# Altium footprint library PcbLibLafe.PcbLib: 294 footprints (part 5 of 19)
Each footprint in its own frame and in the unit in brackets; x right, y up, seen from the top. Pads: shape width x height; smd on the part's side, far side on the other; paste and mask are expansions set on the pad; w line width, h text height; cw(c..) or ccw(c..) is an arc to the next point about the centre after c.
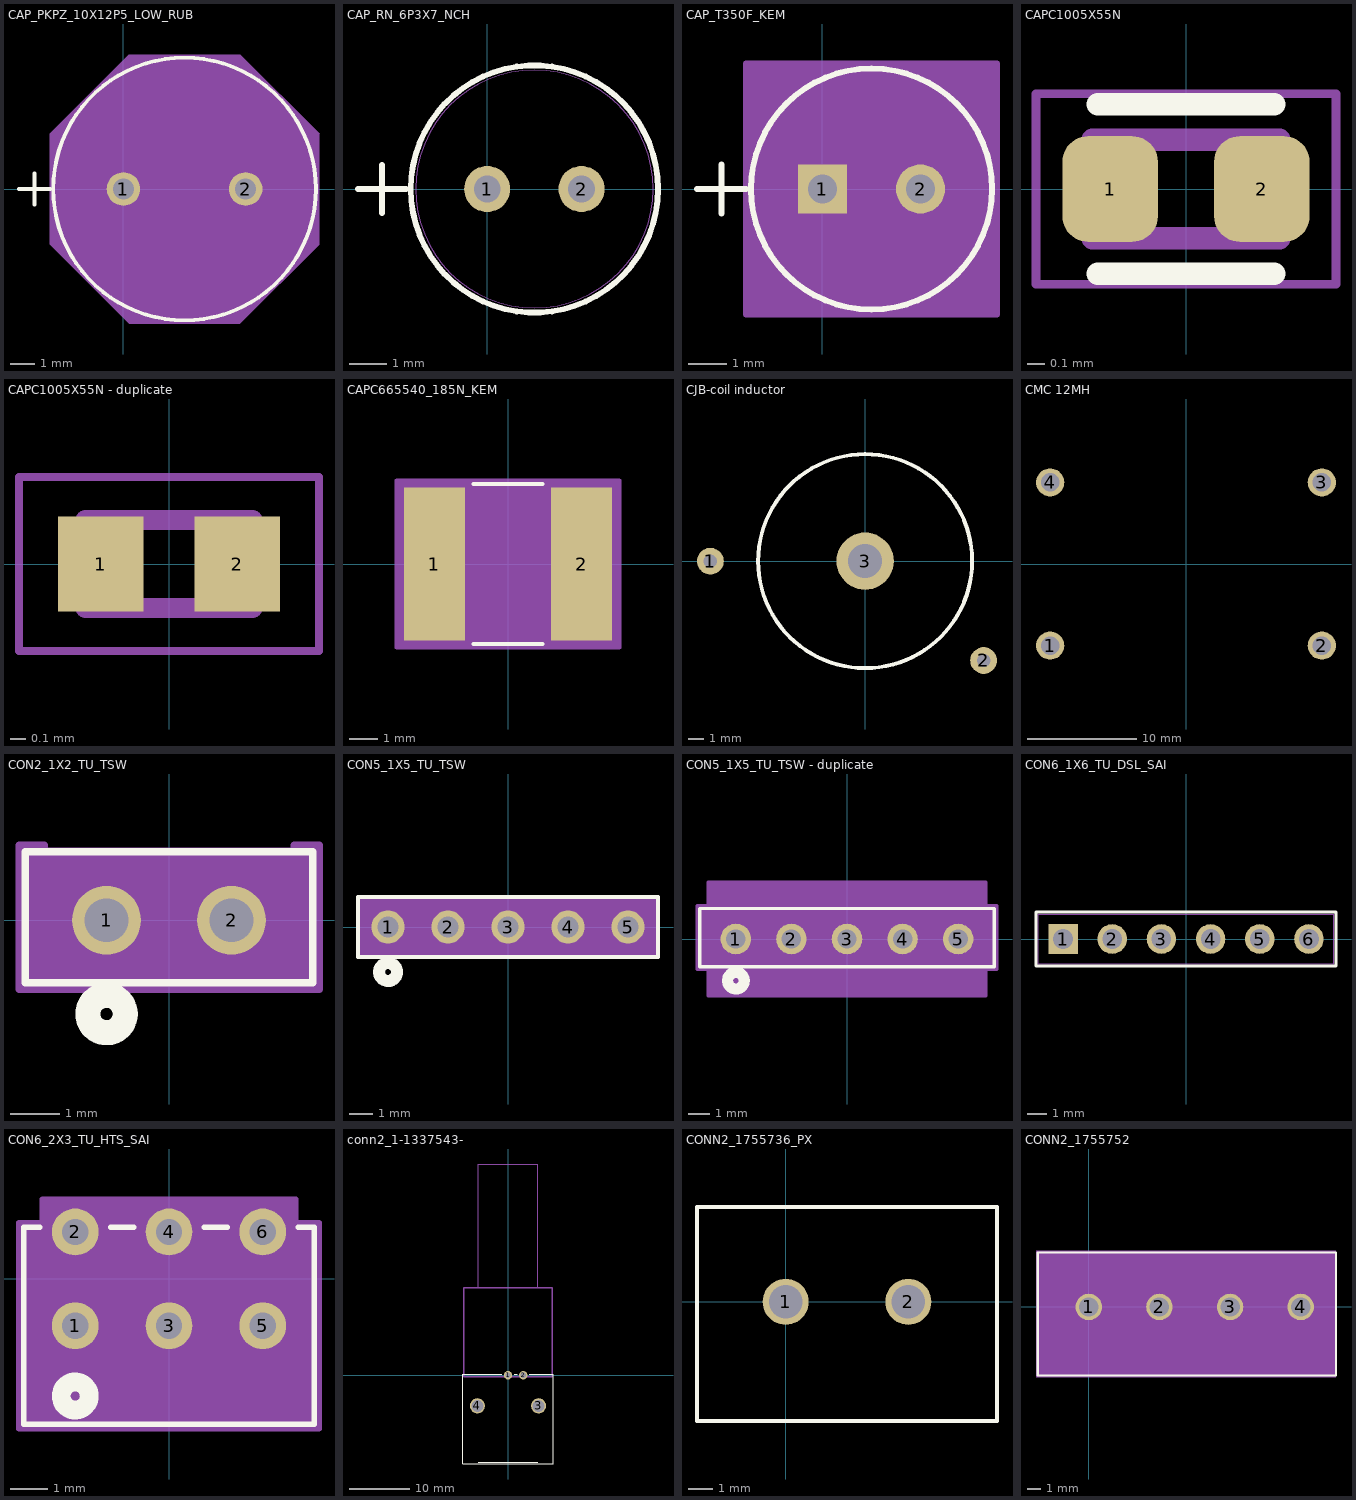
[diagram p4: the footprints below, top view; thin cyan lines are the x and y axes]

## CAP_PKPZ_10X12P5_LOW_RUB [mil]
pads (2):
  round 54 / inner round 60 / far side round 54 hole 34 paste-99999 mask+0: 1(0,0) 2(196.85,0)
Top Overlay:
  circle w6: c98.43,0 r211.5
  lines w6: -168.07,0 -118.07,0 ; -143.07,-25 -143.07,25
Mechanical 13:
  circle w0: c98.43,0 r206.5
  lines w1: -168.07,0 -118.07,0 ; -143.07,-25 -143.07,25
Mechanical 15:
  region: -118.07,89.15 9.28,216.5 187.57,216.5 314.93,89.15 314.93,-89.15 187.57,-216.5 9.28,-216.5 -118.07,-89.15
  lines w1: -118.07,-89.15 -118.07,89.15 9.28,216.5 187.57,216.5 314.93,89.15 314.93,-89.15 187.57,-216.5 9.28,-216.5 -118.07,-89.15
3D body "capacitor-90deg-leads.STEP": height 120.08, standoff -335.94, extent -107.57,-7.87 306.39,805.75

## CAP_RN_6P3X7_NCH [mil]
pads (2):
  round 48 hole 28 mask+0: 1(0,0) 2(98.43,0)
Top Overlay:
  circle w6: c49.21,0 r129
  lines w6: -134.79,0 -84.79,0 ; -109.79,-25 -109.79,25
Mechanical 13:
  circle w0: c49.21,0 r124
  lines w1: -134.79,0 -84.79,0 ; -109.79,-25 -109.79,25
3D body: height 10, standoff 0, extent 0,0 10,10
3D body "CAP_RN_6P3X7_NCH.step": height 315.63, standoff -154.02, extent -75.13,-123.87 173.21,123.88

## CAP_T350F_KEM [mil]
pads (2):
  rect 50x50 / inner round 60 / far side rect 50x50 hole 30 paste-99999 mask-25: 1(0,0)
  round 50 / inner round 60 / far side round 50 hole 30 paste-99999 mask-25: 2(100,0)
Top Overlay:
  circle w6: c50,0 r123
  lines w6: -128,0 -78,0 ; -103,-25 -103,25
Mechanical 13:
  circle w0: c50,0 r118
  lines w1: -128,0 -78,0 ; -103,-25 -103,25
Mechanical 15:
  region: 178,-128 -78,-128 -78,128 178,128
  lines w6: -78,-128 -78,128 178,128 178,-128 -78,-128
3D body "CAP_T350F_KEM.step": height 390, standoff -160, extent -67.99,-117.99 167.99,117.99

## CAPC1005X55N [mm]
pads (2):
  rrect53% 0.54x0.6 smd: 1(-0.43,0) 2(0.43,0)
Top Overlay:
  lines w0.127: -0.5,-0.48 0.5,-0.48 ; -0.5,0.48 0.5,0.48
Mechanical 13:
  lines w0.127: -0.53,-0.28 0.53,-0.28 0.53,0.28 -0.53,0.28 -0.53,-0.28
Mechanical 15:
  lines w0.05: -0.85,-0.54 0.85,-0.54 0.85,0.54 -0.85,0.54 -0.85,-0.54
3D body "step_temp.STEP": height 0.55, standoff 0, extent -0.5,-0.25 0.5,0.25

## CAPC1005X55N - duplicate [mm]
pads (2):
  rect 0.54x0.6 smd: 1(-0.432,0) 2(0.432,0)
Mechanical 13:
  lines w0.127: -0.53,-0.28 -0.53,0.28 0.53,0.28 0.53,-0.28 -0.53,-0.28
Mechanical 15:
  lines w0.05: -0.95,-0.55 -0.95,0.55 0.95,0.55 0.95,-0.55 -0.95,-0.55
3D body "step_temp.STEP": height 0.55, standoff 0, extent -0.5,-0.25 0.5,0.25

## CAPC665540_185N_KEM [mm]
pads (2):
  rect 2.156x5.4 smd paste+0 mask+0: 1(-2.603,0) 2(2.603,0)
Top Overlay:
  lines w0.152: -1.217,-2.827 1.217,-2.827 ; -1.217,2.827 1.217,2.827
Mechanical 13:
  lines w0.025: -3.325,-2.7 -3.325,2.7 ; -3.325,-2.7 -2.275,-2.7 -2.275,2.7 -3.325,2.7 ; -3.325,-2.7 3.325,-2.7 ; -3.325,-2.7 -3.325,2.7 ; -3.325,2.7 3.325,2.7 ; 3.325,-2.7 2.275,-2.7 2.275,2.7 3.325,2.7 ; 3.325,-2.7 3.325,2.7 ; 3.325,-2.7 3.325,2.7
Mechanical 15:
  region: 3.935,-2.954 -3.935,-2.954 -3.935,2.954 3.935,2.954
  lines w0.152: -3.935,-2.954 -3.935,2.954 3.935,2.954 3.935,-2.954 -3.935,-2.954
3D body "CAPC665540_185N_KEM.step": height 1.85, standoff 0, extent -3.325,-2.7 3.325,2.7

## CJB-coil inductor [mil]
pads (3):
  round 70 hole 35: 1(-405,0) 2(310,-260)
  round 150 hole 89: 3(0,0)
Top Overlay:
  circle w10: c0,0 r280

## CMC 12MH [mm]
pads (4):
  round 2.6 hole 1.7: 1(-12.5,-7.5) 2(12.5,-7.5) 3(12.5,7.5) 4(-12.5,7.5)
3D body "7448051012_Download_STP_7448051012_rev1.stp": height 29.75, standoff -5.9, extent -15.334,-10.3 15.334,10.3

## CON2_1X2_TU_TSW [mil]
pads (2):
  round 55 / inner round 60 / far side round 55 hole 35 paste-99999 mask+0: 1(-50,0) 2(50,0)
Top Overlay:
  circle w20: c-50,-75 r15
  lines w6: -115,-50 -115,55 115,55 115,-50 -115,-50
Bottom Overlay:
  circle w20: c-50,-75 r15
Mechanical 13:
  circle w0: c-50,0 r10
  lines w1: -110,-45 -110,50 110,50 110,-45 -110,-45
Mechanical 15:
  region: 120,58 100,58 -100,58 -120,58 -120,-57 -100,-57 100,-57 120,-57
  lines w6: -120,-55 -100,-55 100,-55 120,-55 120,60 100,60 100,50 -100,50 -100,60 -120,60 -120,-55

## CON5_1X5_TU_TSW [mil]
pads (5):
  round 55 / inner round 60 / far side round 55 hole 35 paste-99999 mask+0: 1(-200,0) 2(-100,0) 3(0,0) 4(100,0) 5(200,0)
Top Overlay:
  circle w20: c-200,-75 r15
  lines w6: -250,-50 -250,50 250,50 250,-50 -250,-50
Bottom Overlay:
  circle w20: c-200,-75 r15
Mechanical 13:
  circle w0: c-200,0 r10
  lines w1: -250,-45 -125,-45 125,-45 250,-45 250,50 -250,50 -250,-45
Mechanical 15:
  region: 250,50 -250,50 -250,-50 250,-50

## CON5_1X5_TU_TSW - duplicate [mil]
pads (5):
  round 55 / inner round 60 / far side round 55 hole 35 paste-99999 mask+0: 1(-200,0) 2(-100,0) 3(0,0) 4(100,0) 5(200,0)
Top Overlay:
  circle w20: c-200,-75 r15
  lines w6: -265,-50 265,-50 265,55 -265,55 -265,-50
Bottom Overlay:
  circle w20: c-200,-75 r15
Mechanical 13:
  circle w0: c-200,0 r10
  lines w1: -260,-45 260,-45 260,50 -260,50 -260,-45
Mechanical 15:
  region: 270,60 250,60 250,102 -250,102 -250,60 -270,60 -270,-55 -250,-55 -250,-102 250,-102 250,-55 270,-55
  lines w6: -270,-55 -270,60 -250,60 -250,102 250,102 250,60 270,60 270,-55 250,-55 250,-102 -250,-102 -250,-55 -270,-55
3D body "CON5_1X5_TU_TSW.step": height 500, standoff -200, extent -250,-50 250,50

## CON6_1X6_TU_DSL_SAI [mil]
pads (6):
  rect 60x60 / inner round 60 / far side round 60 hole 40 mask+0: 1(-250,0)
  round 60 hole 40 mask+0: 2(-150,0) 3(-50,0) 4(50,0) 5(150,0) 6(250,0)
Top Overlay:
  lines w6: -305,-55 -305,55 305,55 305,-55 -305,-55
Mechanical 13:
  circle w0: c-250,0 r10
  lines w1: -300,-50 -300,50 300,50 300,-50 -300,-50
3D body "SL-106-G-19.stp": height 66, standoff -99, extent -300,-49.99 300,50.01
3D body: height 10, standoff 0, extent 0,0 10,10

## CON6_2X3_TU_HTS_SAI [mil]
pads (6):
  round 50 / inner round 60 / far side round 50 hole 28 paste-99999 mask+0: 1(-100,-50) 2(-100,50) 3(0,-50) 4(0,50) 5(100,-50) 6(100,50)
Top Overlay:
  circle w20: c-100,-125 r15
  lines w6: -137.77,55 -155,55 -155,-155 155,-155 155,55 137.77,55 ; -62.23,55 -37.77,55 ; 37.77,55 62.23,55
Bottom Overlay:
  circle w20: c-100,-125 r15
Mechanical 13:
  circle w0: c-100,-50 r10
  lines w1: -150,-150 -150,50 150,50 150,-150 -150,-150
Mechanical 15:
  region: 160,60 135,60 135,85 -135,85 -135,60 -160,60 -160,-160 -135,-160 135,-160 160,-160
  lines w6: -160,-160 -135,-160 135,-160 160,-160 160,60 135,60 135,85 -135,85 -135,60 -160,60 -160,-160
3D body "TD-103-G-A.stp": height 311, standoff -166, extent -148,-102 146,98

## conn2_1-1337543- [mil]
pads (4):
  round 55 hole 35 mask+0: 1(0,0) 2(100,0)
  round 99 hole 79: 3(200,-200) 4(-200,-200)
Top Overlay:
  lines w6: -194,-569.8 194,-569.8 ; -40.29,5 -294.37,5 -294.37,-579.8 294.37,-579.8 294.37,5 140.29,5 ; 40.29,5 59.71,5
Mechanical 3:
  lines w6: -194,569.8 -194,1378.8 194,1378.8 194,569.8
Mechanical 40:
  lines w10: -290,-10 290,-10 290,570 -290,570 -290,-10
3D body "BNC.STEP": height 301.18, standoff -490.16, extent -289.37,-1387.64 289.37,10

## CONN2_1755736_PX [mil] "2 position 200 mil"
pads (2):
  round 75 hole 55 mask+0: 1(0,0) 2(200,0)
Top Overlay:
  lines w6: -144.5,-194.39 -144.5,154.61 344.5,154.61 344.5,-194.39 -144.5,-194.39
3D body: height 10, standoff 0, extent 0,0 10,10

## CONN2_1755752 [mil] "4 position 200 mil"
pads (4):
  round 75 hole 55 mask+0: 1(0,0) 2(200,0) 3(400,0)
  round 75 hole 55: 4(600,0)
Top Overlay:
  lines w6: -144.5,-194.39 -144.5,154.61 700,154.61 700,-194.39 -144.5,-194.39
Mechanical 7:
  text "0in/0mm" at 459.5,-12.5 h25
Mechanical 15:
  region: 700,159.61 -149.5,159.61 -149.5,-199.39 700,-199.39
3D body: height 10, standoff 0, extent 0,0 10,10